# Altium footprint library motionboard.PcbLib: 89 footprints (part 3 of 6)
Each footprint in its own frame and in the unit in brackets; x right, y up, seen from the top. Pads: shape width x height; smd on the part's side, far side on the other; paste and mask are expansions set on the pad; w line width, h text height; cw(c..) or ccw(c..) is an arc to the next point about the centre after c.
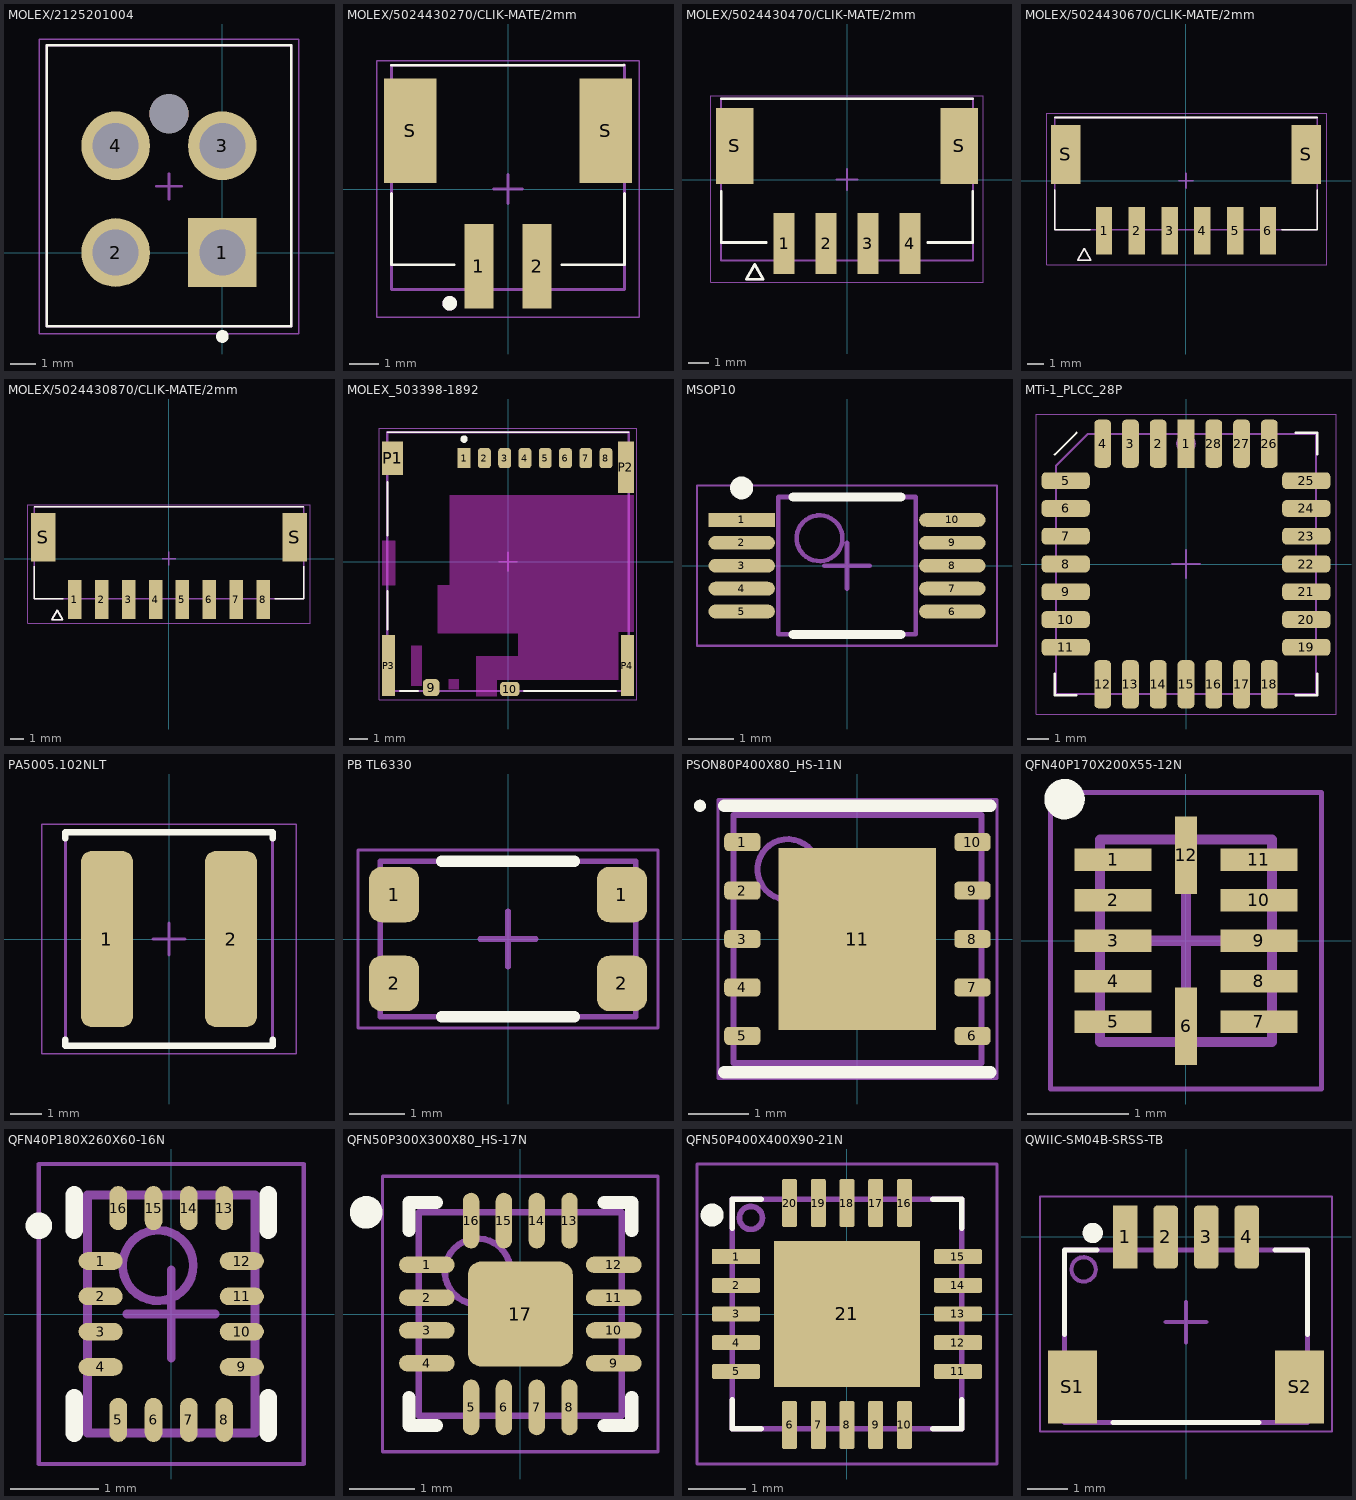
[diagram p2: the footprints below, top view; thin cyan lines are the x and y axes]

## MOLEX/2125201004 [mm]
pads (5):
  rect 2.7x2.7 hole 1.8: 1(0,0)
  round 2.7 hole 1.8: 2(-4.2,0) 3(0,4.2) 4(-4.2,4.2)
  round 1.54 hole 1.54 unplated: ""(-2.1,5.46)
Top Overlay:
  circle w0.3: c0,-3.3 r0.1
  lines w0.1: -6.9,-2.9 2.7,-2.9 2.7,8.15 -6.9,8.15 -6.9,-2.9
Top Solder:
  circle w0.846: c-2.1,5.46 r0.423
Bottom Solder:
  circle w1.226: c-4.2,4.2 r0.613
  circle w1.226: c0,4.2 r0.613
  circle w1.226: c-4.2,0 r0.613
Top Assembly:
  lines w0.1: -6.9,-2.9 2.7,-2.9 2.7,8.15 -6.9,8.15 -6.9,-2.9
Top Courtyard:
  lines w0.05: -7.2,-3.2 3,-3.2 3,8.4 -7.2,8.4 -7.2,-3.2
  lines w0.1: -2.6,2.6 -1.6,2.6 ; -2.1,2.1 -2.1,3.1
Top Designator:
  text ".Designator" at -4.805,2.166 h1.2
3D body "2125201004.stp.STEP": height 13.85, standoff -3.41, extent -6.909,-2.897 2.691,8.153

## MOLEX/5024430270/CLIK-MATE/2mm [mm]
pads (4):
  rect 1x2.9 smd mask+0.076: 1(-1,-2.65) 2(1,-2.65)
  rect 1.8x3.6 smd mask+0.076: S(-3.35,2) S(3.35,2)
Top Overlay:
  circle w0.3: c-2,-3.925 r0.1
  lines w0.1: -4,-0.15 -4,-2.6 -1.85,-2.6 ; -4,4.25 3.981,4.261 ; 1.85,-2.6 4,-2.6 4,-0.15
Top Assembly:
  circle w0.3: c-2,-3.925 r0.1
  lines w0.1: -4,-3.45 4.007,-3.45 4.007,4.25 -4,4.25 -4,-3.45
Top Courtyard:
  lines w0.05: -4.5,-4.4 -4.5,4.4 4.5,4.4 4.5,-4.4 -4.5,-4.4
  lines w0.1: -0.5,0 0.5,0 ; 0,-0.5 0,0.5
Top Designator:
  text ".Designator" at -2.705,-0.272 h1.2
3D body "5024430270.STEP": height -0.43, standoff -7.93, extent -3.956,-3.467 4.044,4.233

## MOLEX/5024430470/CLIK-MATE/2mm [mm]
pads (6):
  rect 1x2.9 smd mask+0.076: 1(-3,-3.05) 2(-1,-3.05) 3(1,-3.05) 4(3,-3.05)
  rect 1.8x3.6 smd mask+0.076: S(-5.35,1.6) S(5.35,1.6)
Top Overlay:
  lines w0.127: -6,-0.55 -6,-3 -3.85,-3 ; -6,3.85 6,3.85 ; 3.85,-3 6,-3 6,-0.55 ; -4.8,-4.75 -4,-4.75 -4.4,-4.05 -4.8,-4.75
Top Assembly:
  lines w0.1: -6,-3.85 6,-3.85 6,3.85 -6,3.85 -6,-3.85 ; -4.8,-4.75 -4,-4.75 -4.4,-4.05 -4.8,-4.75
Top Courtyard:
  lines w0.05: -6.5,-4.9 -6.5,4 6.5,4 6.5,-4.9 -6.5,-4.9
  lines w0.1: -0.5,0 0.5,0 ; 0,-0.5 0,0.5
Top Designator:
  text ".Designator" at -2.705,-0.722 h1.2
3D body "5024430470.stp.STEP": height 7.47, standoff -0.03, extent -6,-3.892 6,3.808

## MOLEX/5024430670/CLIK-MATE/2mm [mm]
pads (8):
  rect 1x2.9 smd: 1(-5,-3.05) 2(-3,-3.05) 3(-1,-3.05) 4(1,-3.05) 5(3,-3.05) 6(5,-3.05)
  rect 1.8x3.6 smd: S(-7.35,1.6) S(7.35,1.6)
Top Overlay:
  lines w0.1: -8,-0.55 -8,-3 -5.85,-3 ; -8,3.85 8,3.85 ; 5.85,-3 8,-3 8,-0.55 ; -6.6,-4.85 -6.2,-4.15 -5.8,-4.85 -6.6,-4.85
Top Assembly:
  lines w0.1: -8,-3 8,-3 8,3.85 -8,3.85 -8,-3 ; -6.6,-4.85 -6.2,-4.15 -5.8,-4.85 -6.6,-4.85
Top Courtyard:
  lines w0.05: -8.5,-5.12 8.6,-5.12 8.6,4.1 -8.5,4.1 -8.5,-5.12
  lines w0.1: -0.45,0 0.45,0 ; 0,-0.45 0,0.45
Top Designator:
  text ".Designator" at -2.655,-0.782 h1.2
3D body "5024430670.stp.STEP": height 7.47, standoff -0.03, extent -8,-3.765 8,3.935

## MOLEX/5024430870/CLIK-MATE/2mm [mm]
pads (10):
  rect 1x2.9 smd: 1(-7,-3.05) 2(-5,-3.05) 3(-3,-3.05) 4(-1,-3.05) 5(1,-3.05) 6(3,-3.05) 7(5,-3.05) 8(7,-3.05)
  rect 1.8x3.6 smd: S(-9.35,1.6) S(9.35,1.6)
Top Overlay:
  lines w0.1: -10,-0.55 -10,-3 -7.85,-3 ; -10,3.85 10,3.85 ; 7.85,-3 10,-3 10,-0.55 ; -8.7,-4.55 -8.3,-3.85 -7.9,-4.55 -8.7,-4.55
Top Assembly:
  lines w0.1: -10,-3 -10,3.85 10,3.85 10,-3 -10,-3 ; -8.7,-4.55 -8.3,-3.85 -7.9,-4.55 -8.7,-4.55
Top Courtyard:
  lines w0.05: -10.5,-4.8 10.5,-4.8 10.5,4 -10.5,4 -10.5,-4.8
  lines w0.1: -0.5,0 0.5,0 ; 0,-0.5 0,0.5
Top Designator:
  text ".Designator" at -2.705,-0.672 h1.2
3D body "5024430870.stp.STEP": height 7.47, standoff -0.03, extent -10,-3.765 10,3.935

## MOLEX_503398-1892 [mm]
pads (14):
  rect 0.7x1.1 smd: 1(-2.38,5.625)
  rrect50% 0.7x1.1 smd: 2(-1.28,5.625) 3(-0.18,5.625) 4(0.92,5.625) 5(2.02,5.625) 6(3.12,5.625) 7(4.22,5.625) 8(5.32,5.625)
  rrect50% 0.9x0.93 smd: 9(-4.17,-6.84)
  rrect50% 1.05x0.78 smd: 10(0.095,-6.915)
  rect 1.14x1.83 smd: P1(-6.26,5.61)
  rect 0.86x2.8 smd: P2(6.4,5.125)
  rect 0.7x3.33 smd: P3(-6.48,-5.64) P4(6.48,-5.64)
Top Layer keep-out:
  region: 6.83,-3.8 6,-3.8 6,-6.4 -0.6,-6.4 -0.6,-7.305 -1.73,-7.305 -1.73,-5.125 0.57,-5.125 0.57,-3.875 -3.82,-3.875 -3.82,-1.275 -3.17,-1.275 -3.17,3.6 6.83,3.6
  region: -2.67,-6.93 -3.223,-6.93 -3.223,-6.375 -2.67,-6.375
  region: -4.685,-6.738 -5.245,-6.738 -5.245,-4.575 -4.685,-4.575
  region: -6.13,-1.277 -6.842,-1.277 -6.842,1.125 -6.13,1.125
Top Overlay:
  circle w0.2: c-2.388,6.655 r0.1
  lines w0.1: -6.55,-3.675 -6.55,-1.575 ; -6.55,1.425 -6.55,4.325 ; -6.55,7.025 6.55,7.025 ; -5.876,-7.025 -4.874,-7.025 ; 0.874,-7.025 5.876,-7.025
Top Assembly:
  circle w0.2: c-2.38,5.775 r0.1
  lines w0.127: -6.55,-7.025 -6.55,7.025 6.55,7.025 6.55,-7.025 -6.55,-7.025
Top Courtyard:
  lines w0.05: -7,-7.5 -7,7.25 7,7.25 7,-7.5 -7,-7.5
  lines w0.1: -0.5,0 0.5,0 ; 0,-0.5 0,0.5
Top Designator:
  text ".Designator" at -2.705,0.373 h1.2
3D body "Micro SD Card.STEP": height 1.45, standoff 0.34, extent -4.966,-6.213 6.083,8.814
3D body "5033981892--3DModel-STEP-1.STEP": height 1.4, standoff 0, extent -6.55,-7.101 6.55,6.969

## MSOP10 [mm] "TSSOP, 10-Leads, Body 3.00x3.00mm, Pitch 0.50mm, Thermal Pad 1.68.2x1.68.2mm, IPC Medium Density"
height 1.1
pads (10):
  rect 1.45x0.3 smd: 1(-2.3,1)
  oval 1.45x0.3 smd: 2(-2.3,0.5) 3(-2.3,0) 4(-2.3,-0.5) 5(-2.3,-1) 6(2.3,-1) 7(2.3,-0.5) 8(2.3,0) 9(2.3,0.5) 10(2.3,1)
Top Overlay:
  circle w0.25: c-2.3,1.7 r0.125
  lines w0.2: -1.175,-1.5 1.175,-1.5 ; -1.175,1.5 1.175,1.5
Top Assembly:
  circle w0.1: c-0.6,0.6 r0.5
  lines w0.1: -1.5,-1.5 1.5,-1.5 1.5,1.5 -1.5,1.5 -1.5,-1.5
Top Courtyard:
  lines w0.05: -3.275,-1.75 3.275,-1.75 3.275,1.75 -3.275,1.75 -3.275,-1.75
  lines w0.1: -0.5,0 0.5,0 ; 0,-0.5 0,0.5
Top Designator:
  text ".Designator" at -2.705,-0.184 h1.2
3D body "MSOP10.STEP": height 1.15, standoff 0, extent -2.45,-1.5 2.45,1.5

## MTi-1_PLCC_28P [mm] "MTi-1-series PLCC board"
height 2.55
pads (28):
  rect 0.76x2.2 smd: 1(0,5.5)
  rrect50% 0.76x2.2 smd: 2(-1.27,5.5) 3(-2.54,5.5) 4(-3.81,5.5) 12(-3.81,-5.5) 13(-2.54,-5.5) 14(-1.27,-5.5) 15(0,-5.5) 16(1.27,-5.5) 17(2.54,-5.5) 18(3.81,-5.5) 26(3.81,5.5) 27(2.54,5.5) 28(1.27,5.5)
  rrect50% 2.2x0.76 smd: 5(-5.5,3.81) 6(-5.5,2.54) 7(-5.5,1.27) 8(-5.5,0) 9(-5.5,-1.27) 10(-5.5,-2.54) 11(-5.5,-3.81) 19(5.5,-3.81) 20(5.5,-2.54) 21(5.5,-1.27) 22(5.5,0) 23(5.5,1.27) 24(5.5,2.54) 25(5.5,3.81)
Top Overlay:
  lines w0.1: -6,-5 -6,-6 -5,-6 ; -6,5 -5,6 ; 5,-6 6,-6 6,-5 ; 5,6 6,6 6,5
Top Assembly:
  circle w0.2: c0,5.5 r0.35
  lines w0.1: -5.95,-5.95 5.95,-5.95 5.95,5.95 -4.48,5.95 -5.95,4.48 -5.95,-5.95
Top Courtyard:
  lines w0.05: -6.858,-6.858 6.858,-6.858 6.858,6.858 -6.858,6.858 -6.858,-6.858
  lines w0.1: -0.635,0 0.635,0 ; 0,-0.635 0,0.635
Top Designator:
  text ".Designator" at -2.705,-0.272 h1.2
3D body "MTi-1-SoB_v2.STEP": height 2.6, standoff 0.01, extent -6.05,-6.045 6.05,6.055

## PA5005.102NLT [mm] "PA5005 series Molded Inductor, 2-Leads, Body 6.40x6.60mm, Manufacturer Guidelines"
height 5
pads (2):
  rrect40% 1.65x5.6 smd: 1(-1.975,0) 2(1.975,0)
Top Overlay:
  lines w0.2: -3.3,-3.2 -3.3,-3.4 3.3,-3.4 3.3,-3.2 ; -3.3,3.2 -3.3,3.4 3.3,3.4 3.3,3.2
Top Assembly:
  lines w0.1: -3.3,-3.4 3.3,-3.4 3.3,3.4 -3.3,3.4 -3.3,-3.4
Top Courtyard:
  lines w0.05: -4.05,-3.65 4.05,-3.65 4.05,3.65 -4.05,3.65 -4.05,-3.65
  lines w0.1: -0.5,0 0.5,0 ; 0,-0.5 0,0.5
Top Designator:
  text ".Designator" at -2.705,-0.272 h1.2
3D body: height 5, standoff 0, extent -3.3,-3.4 3.3,3.4

## PB TL6330 [mm]
pads (4):
  rrect50% 0.9x1 smd: 1(-2.05,0.8) 1(2.05,0.8) 2(-2.05,-0.8) 2(2.05,-0.8)
Top Overlay:
  lines w0.2: -1.2,-1.4 1.2,-1.4 ; -1.2,1.4 1.2,1.4
Top Assembly:
  lines w0.1: -2.3,-1.4 -2.3,1.4 2.3,1.4 2.3,-1.4 -2.3,-1.4
Top Courtyard:
  lines w0.05: -2.7,-1.6 -2.7,1.6 2.7,1.6 2.7,-1.6 -2.7,-1.6
  lines w0.1: -0.5,0 0.5,0 ; 0,-0.5 0,0.5
Top Designator:
  text ".Designator" at -2.705,-0.272 h1.2
3D body "TL6330AF200Q--3DModel-STEP-520916.STEP": height 1.89, standoff -0.01, extent -2.3,-1.4 2.3,1.4

## PSON80P400X80_HS-11N [mm] "PSON, 10-Leads, Body 4.00x4.00mm, Pitch 0.80mm, Thermal Pad 3.00x2.60mm, IPC Medium Density"
height 0.8
pads (11):
  rrect50% 0.6x0.3 smd: 1(-1.9,1.6) 2(-1.9,0.8) 3(-1.9,0) 4(-1.9,-0.8) 5(-1.9,-1.6) 6(1.9,-1.6) 7(1.9,-0.8) 8(1.9,0) 9(1.9,0.8) 10(1.9,1.6)
  rect 2.6x3 smd paste-1.3: 11(0,0)
Top Overlay:
  circle w0.1: c-2.6,2.2 r0.05
  lines w0.2: -2.2,-2.2 2.2,-2.2 ; -2.2,2.2 2.2,2.2
Top Paste:
  rectangle: -1.2,0.1 -0.1,1.4
  rectangle: -1.2,-1.4 -0.1,-0.1
  rectangle: 0.1,0.1 1.2,1.4
  rectangle: 0.1,-1.4 1.2,-0.1
Top Assembly:
  circle w0.1: c-1.15,1.15 r0.5
  lines w0.1: -2.05,-2.05 -2.05,2.05 2.05,2.05 2.05,-2.05 -2.05,-2.05
Top Courtyard:
  lines w0.05: -2.305,-2.3 -2.305,2.3 2.305,2.3 2.305,-2.3 -2.305,-2.3
  lines w0.1: -0.5,0 0.5,0 ; 0,-0.5 0,0.5
Top Designator:
  text ".Designator" at -2.89,-0.272 h1.2
3D body "PSON80P400X80_HS-11N.step": height 0.8, standoff 0, extent -2.051,-2.05 2.051,2.05

## QFN40P170X200X55-12N [mm]
pads (12):
  rect 0.762x0.22 smd: 1(-0.72,0.8) 2(-0.72,0.4) 3(-0.72,0) 4(-0.72,-0.4) 5(-0.72,-0.8) 7(0.72,-0.8) 8(0.72,-0.4) 9(0.72,0) 10(0.72,0.4) 11(0.72,0.8)
  rect 0.22x0.762 smd: 6(0,-0.845) 12(0,0.845)
Top Overlay:
  circle w0.2: c-1.2,1.4 r0.1
Top Assembly:
  lines w0.1: -0.85,-1 -0.85,1 0.85,1 0.85,-1 -0.85,-1
Top Courtyard:
  lines w0.05: -1.34,-1.465 -1.34,1.465 1.34,1.465 1.34,-1.465 -1.34,-1.465
  lines w0.1: -0.5,0 0.5,0 ; 0,-0.5 0,0.5
Top Designator:
  text ".Designator" at -2.722,-0.217 h1.2
3D body "UQFN-12.STEP": height 0.55, standoff 0, extent -0.85,-1 0.85,1

## QFN40P180X260X60-16N [mm] "QFN, 16-Leads, Body 1.80x2.60mm, Pitch 0.40mm, IPC Medium Density"
height 0.6
pads (16):
  oval 0.5x0.2 smd: 1(-0.8,0.6) 2(-0.8,0.2) 3(-0.8,-0.2) 4(-0.8,-0.6) 9(0.8,-0.6) 10(0.8,-0.2) 11(0.8,0.2) 12(0.8,0.6)
  oval 0.2x0.5 smd: 5(-0.6,-1.2) 6(-0.2,-1.2) 7(0.2,-1.2) 8(0.6,-1.2) 13(0.6,1.2) 14(0.2,1.2) 15(-0.2,1.2) 16(-0.6,1.2)
Top Overlay:
  circle w0.2: c-1.5,1 r0.05
  lines w0.2: -1.1,-1.35 -1.1,-0.95 ; -1.1,0.95 -1.1,1.35 ; 1.1,-1.35 1.1,-0.95 ; 1.1,0.95 1.1,1.35
Top Assembly:
  circle w0.1: c-0.15,0.55 r0.4
  lines w0.1: -0.95,-1.35 -0.95,1.35 0.95,1.35 0.95,-1.35 -0.95,-1.35
Top Courtyard:
  lines w0.05: -1.5,-1.7 -1.5,1.7 1.5,1.7 1.5,-1.7 -1.5,-1.7
  lines w0.1: -0.5,0 0.5,0 ; 0,-0.5 0,0.5
Top Designator:
  text ".Designator" at -2.767,-0.272 h1.2
3D body "QFN40P180X260X60-16N.step": height 0.6, standoff 0, extent -0.96,-1.36 0.96,1.36

## QFN50P300X300X80_HS-17N [mm] "QFN, 16-Leads, Body 3.00x3.00mm, Pitch 0.50mm, Thermal Pad 1.60x1.60mm, IPC Medium Density"
height 0.8
pads (17):
  oval 0.85x0.25 smd: 1(-1.425,0.75) 2(-1.425,0.25) 3(-1.425,-0.25) 4(-1.425,-0.75) 9(1.425,-0.75) 10(1.425,-0.25) 11(1.425,0.25) 12(1.425,0.75)
  oval 0.25x0.85 smd: 5(-0.75,-1.425) 6(-0.25,-1.425) 7(0.25,-1.425) 8(0.75,-1.425) 13(0.75,1.425) 14(0.25,1.425) 15(-0.25,1.425) 16(-0.75,1.425)
  rrect25% 1.6x1.6 smd: 17(0,0)
Top Overlay:
  circle w0.25: c-2.35,1.55 r0.125
  lines w0.2: -1.7,-1.275 -1.7,-1.7 -1.275,-1.7 ; -1.7,1.275 -1.7,1.7 -1.275,1.7 ; 1.275,-1.7 1.7,-1.7 1.7,-1.275 ; 1.275,1.7 1.7,1.7 1.7,1.275
Top Assembly:
  circle w0.1: c-0.65,0.65 r0.5
  lines w0.1: -1.55,-1.55 1.55,-1.55 1.55,1.55 -1.55,1.55 -1.55,-1.55
Top Courtyard:
  lines w0.05: -2.1,-2.1 2.1,-2.1 2.1,2.1 -2.1,2.1 -2.1,-2.1
  lines w0.1: -0.5,0 0.5,0 ; 0,-0.5 0,0.5
Top Designator:
  text ".Designator" at -2.942,-0.272 h1.2
3D body "QFN50P300X300X80_HS-17N.step": height 0.8, standoff 0, extent -1.56,-1.56 1.56,1.56

## QFN50P400X400X90-21N [mm]
pads (21):
  rect 0.84x0.26 smd: 1(-1.935,1)
  rrect25% 0.84x0.26 smd: 2(-1.935,0.5) 3(-1.935,0) 4(-1.935,-0.5) 5(-1.935,-1) 11(1.935,-1) 12(1.935,-0.5) 13(1.935,0) 14(1.935,0.5) 15(1.935,1)
  rrect25% 0.26x0.84 smd: 6(-1,-1.935) 7(-0.5,-1.935) 8(0,-1.935) 9(0.5,-1.935) 10(1,-1.935) 16(1,1.935) 17(0.5,1.935) 18(0,1.935) 19(-0.5,1.935) 20(-1,1.935)
  rect 2.54x2.54 smd paste-0.467: 21(0,0)
Top Overlay:
  circle w0.2: c-2.35,1.725 r0.1
  lines w0.1: -2,-1.5 -2,-2 -1.5,-2 ; -2,1.5 -2,2 -1.5,2 ; 1.5,-2 2,-2 2,-1.5 ; 1.5,2 2,2 2,1.5
Top Assembly:
  circle w0.1: c-1.675,1.675 r0.2
  lines w0.1: -2,-2 2,-2 2,2 -2,2 -2,-2
Top Courtyard:
  lines w0.05: -2.615,-2.615 -2.615,2.615 2.615,2.615 2.615,-2.615 -2.615,-2.615
  lines w0.1: -0.5,0 0.5,0 ; 0,-0.5 0,0.5
Top Designator:
  text ".Designator" at -2.705,-0.272 h1.2
3D body "step_temp.STEP": height 0.9, standoff 0, extent -2,-2 2,2

## QWIIC-SM04B-SRSS-TB [mm]
pads (6):
  rect 0.6x1.55 smd: 1(-1.5,0)
  rrect30% 0.6x1.55 smd: 2(-0.5,0) 3(0.5,0) 4(1.5,0)
  rect 1.2x1.8 smd: S1(-2.8,-3.7) S2(2.8,-3.7)
Top Overlay:
  circle w0.3: c-2.3,0.1 r0.1
  lines w0.127: -3,-2.4 -3,-0.325 -2.2,-0.325 ; -1.8,-4.575 1.8,-4.575 ; 2.2,-0.325 3,-0.325 3,-2.4
Top Assembly:
  circle w0.1: c-2.525,-0.8 r0.3
  lines w0.127: -3,-4.575 3,-4.575 3,-0.325 -3,-0.325 -3,-4.575
Top Courtyard:
  lines w0.05: -3.6,-4.8 3.6,-4.8 3.6,1 -3.6,1 -3.6,-4.8
  lines w0.1: -0.5,-2.1 0.5,-2.1 ; 0,-2.6 0,-1.6
Top Designator:
  text ".Designator" at -2.705,-2.172 h1.2
3D body "QWIIC-SM04B-SRSS-TB.STEP": height 2.94, standoff -0.02, extent -3,-4.597 3,0.353